# Altium schematic symbol library Altium_Lib.SchLib: 403 symbols (part 2 of 4)
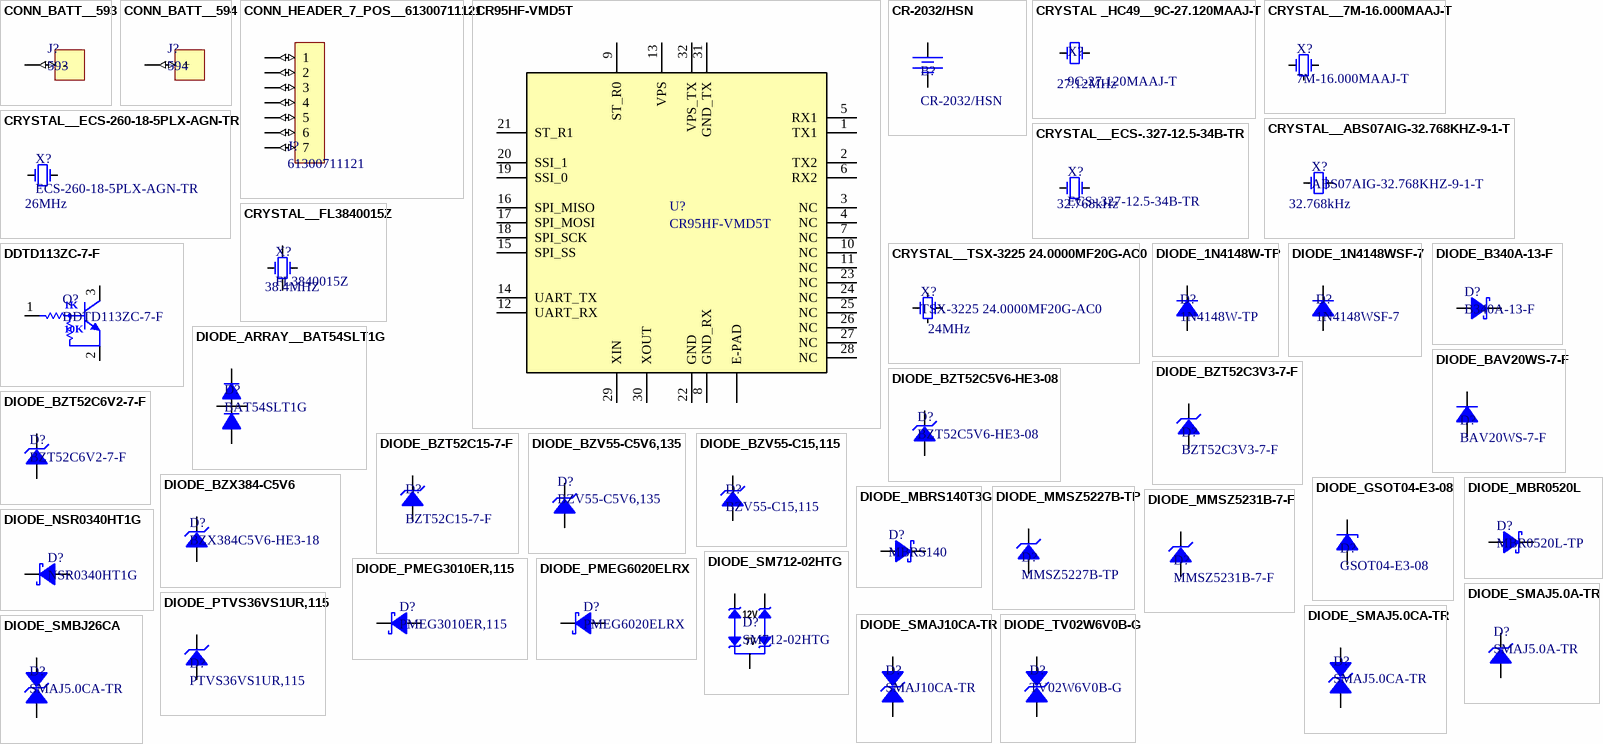
[diagram p12: symbols CONN_BATT__593 to DIODE_TV02W6V0B-G]

## CRYSTAL__ECS-.327-12.5-34B-TR
designator X?, comment ECS-.327-12.5-34B-TR  Frequency: 32.768kHz
CRYSTAL 32.7680KHZ 12.5PF SMD; Manufacturer: ECS Inc.; Operating Mode: Fundamental; Frequency Tolerance: ±20ppm; Size / Dimension: 0.126" L x 0.059" W (3.20mm x 1.50mm); Height - Seated (Max): 0.035" (0.90mm); Type: kHz Crystal (Tuning Fork); Ratings: -; RoHS: RoHS Compliant; Supplier: Digi-Key; Mounting Type: Surface Mount; Load Capacitance: 12.5pF; Packaging: Tape & Reel (TR); Part Status: Active; Frequency Stability: -; Manufacturer Part Number: ECS-.327-12.5-34B-TR; Operating Temperature: -40°C ~ 85°C; Category: Crystals, Oscillators, Resonators; Package / Case: 2-SMD, No Lead; ComponentLink1URL: http://www.ecsxtal.com/store/pdf/ecx-31b.pdf; ComponentLink1Description: http://www.ecsxtal.com/store/pdf/ecx-31b.pdf; Pricing: 3000=0.2445, 6000=0.23635, 15000=0.2282 (USD); Stock: 306000; Supplier Part Number: XC1617TR-ND
footprint XTAL_3.2mm_1.5mm_2pad
pins: 1 OSC1, 2  OSC2

## CRYSTAL__FL3840015Z
designator X?, comment FL3840015Z  Frequency: 38.4MHZ
CRYSTAL 38.4MHZ 10PF SMD; Manufacturer: Diodes Incorporated; Frequency Tolerance: ±10ppm; Operating Mode: Fundamental; Package / Case: 4-SMD, No Lead; Load Capacitance: 10pF; RoHS: RoHS Compliant; Part Status: Active; Supplier: Digi-Key; Ratings: -; Operating Temperature: -30°C ~ 85°C; Packaging: Tape & Reel (TR); Type: MHz Crystal; Category: Crystals, Oscillators, Resonators; Frequency Stability: ±10ppm; Mounting Type: Surface Mount; Manufacturer Part Number: FL3840015Z; Height - Seated (Max): 0.030" (0.75mm); Size / Dimension: 0.126" L x 0.098" W (3.20mm x 2.50mm); ComponentLink1URL: https://media.digikey.com/pdf/Data%20Sheets/Pericom%20PDFs/FL3840015Z_VerA.pdf; ComponentLink1Description: https://media.digikey.com/pdf/Data%20Sheets/Pericom%20PDFs/FL3840015Z_VerA.pdf; Pricing: 3000=0.345, 6000=0.3335, 15000=0.322 (USD); Stock: 6000; Supplier Part Number: FL3840015ZTR-ND
footprint XTAL_3.2mm_2.5mm_4pad
pins: 1 OSC1, 2 GND (power), 3  OSC2, 4 GND (power)

## CRYSTAL__TSX-3225 24.0000MF20G-AC0
designator X?, comment TSX-3225 24.0000MF20G-AC0  Frequency: 24MHz
CRYSTAL 24.0000MHZ 9PF SMD; Manufacturer: EPSON; Frequency Stability: ±20ppm; Operating Mode: Fundamental; Frequency Tolerance: ±10ppm; Ratings: -; Height - Seated (Max): 0.024" (0.60mm); Size / Dimension: 0.126" L x 0.098" W (3.20mm x 2.50mm); Type: MHz Crystal; Package / Case: 4-SMD, No Lead; Load Capacitance: 9pF; Part Status: Active; Supplier: Digi-Key; Packaging: Tape & Reel (TR); RoHS: RoHS Compliant; Operating Temperature: -40°C ~ 105°C; Mounting Type: Surface Mount; Category: Crystals, Oscillators, Resonators; Manufacturer Part Number: TSX-3225 24.0000MF20G-AC0; ComponentLink1URL: https://support.epson.biz/td/api/doc_check.php?dl=brief_FA-238V_en.pdf; ComponentLink1Description: https://support.epson.biz/td/api/doc_check.php?dl=brief_FA-238V_en.pdf; Pricing: 1000=0.272, 3000=0.255, 5000=0.2465, 10000=0.238 (USD); Supplier Part Number: SER4185TR-ND
footprint XTAL_3.2mm_2.5mm_4pad
pins: 1 OSC1, 2 GND (power), 3  OSC2, 4 GND (power)

## DDTD113ZC-7-F
designator Q?
TRANS PREBIAS NPN 200MW SOT23-3; Manufacturer: Diodes Incorporated; Transistor Type: NPN - Pre-Biased; DC Current Gain (hFE) (Min) @ Ic, Vce: 56 @ 50mA, 5V; Current - Collector Cutoff (Max): 500nA; Vce Saturation (Max) @ Ib, Ic: 300mV @ 2.5mA, 50mA; Part Status: Active; Supplier: Digi-Key; Category: Discrete Semiconductor Products; Supplier Device Package: SOT-23-3; Package / Case: TO-236-3, SC-59, SOT-23-3; RoHS: RoHS Compliant; Packaging: Tape & Reel (TR); Mounting Type: Surface Mount; Manufacturer Part Number: DDTD113ZC-7-F; Base Part Number: DTD113; ComponentLink1URL: https://www.diodes.com/assets/Datasheets/ds30384.pdf; ComponentLink1Description: https://www.diodes.com/assets/Datasheets/ds30384.pdf; Pricing: 3000=0.05566, 6000=0.0484, 15000=0.04114, 30000=0.03872, 75000=0.0363, 150000=0.03146 (USD); Supplier Part Number: DDTD113ZC-7FDITR-ND
footprint SOT23_L (SOT23, 3-Leads, Body 2.9x1.3mm, Pitch 0.95mm, Lead Span 2.3mm, IPC High Density)
pins: 1 B, 2 E, 3 C
text: 1K; 10K

## DIODE_1N4148W-TP
designator D?, comment 1N4148W-TP
DIODE GEN PURP 100V 150MA SOD123; Manufacturer: Micro Commercial Co; Capacitance @ Vr, F: 2pF @ 0V, 1MHz; Diode Type: Standard; Speed: Small Signal =< 200mA (Io), Any Speed; Supplier: Digi-Key; Mounting Type: Surface Mount; Base Part Number: 1N4148W; Operating Temperature - Junction: -65°C ~ 150°C; Supplier Device Package: SOD-123; Current - Average Rectified (Io): 150mA; RoHS: RoHS Compliant; Manufacturer Part Number: 1N4148W-TP; Package / Case: SOD-123; Packaging: Cut Tape (CT); Part Status: Active; Category: Discrete Semiconductor Products; Pricing: 1=0.14, 10=0.131, 100=0.0856, 500=0.04186, 1000=0.02854 (USD); ComponentLink1URL: http://www.mccsemi.com/up_pdf/1N4148W(SOD123).pdf; ComponentLink1Description: http://www.mccsemi.com/up_pdf/1N4148W(SOD123).pdf; Stock: 1856917; Supplier Part Number: 1N4148WTPMSCT-ND
footprint SOD123
pins: 1 A, 2 K

## DIODE_1N4148WSF-7
designator D?, comment 1N4148WSF-7
DIODE GEN PURP 100V 250MA SOD323; Manufacturer: Diodes; Reverse Recovery Time: 4ns; Peak Non-Repetitive Surge Current: 4A; Element Configuration: Single; Supplier 1: Avnet; Manufacturer Part Number: 1N4148WSF-7; Stock 1: 0; Pricing 1: 3000=0.0321, 6000=0.0289, 12000=0.0289, 18000=0.0251, 24000=0.0251, 30000=0.0225, 300000=0.02 (USD); Mount: Surface Mount; Case/Package: SOD; Number of Pins: 2; Contact Plating: Tin,Matte; Min Operating Temperature: -55°C; Max Operating Temperature: 150°C; Package Quantity: 3000; Packaging: Tape and Reel; Forward Current: 250mA; Average Rectified Current: 250mA; Max Repetitive Reverse Voltage (Vrrm): 100V; Max Reverse Voltage (DC): 100V; Lead Free: Lead Free; RoHS Compliant: Yes; Supplier Part Number 1: 1N4148WSF-7
footprint SOD323F__SC90
pins: 1 A, 2 K

## DIODE_ARRAY__BAT54SLT1G
designator D?, comment BAT54SLT1G
DIODE ARRAY SCHOTTKY 30V SOT23-3; Manufacturer: ON Semiconductor; Current - Average Rectified (Io) (per Diode): 200mA (DC); Current - Reverse Leakage @ Vr: 2µA @ 25V; Diode Configuration: 1 Pair Series Connection; Reverse Recovery Time (trr): 5ns; Speed: Small Signal =< 200mA (Io), Any Speed; Voltage - Forward (Vf) (Max) @ If: 800mV @ 100mA; Category: Discrete Semiconductor Products; Diode Type: Schottky; Manufacturer Part Number: BAT54SLT1G; Mounting Type: Surface Mount; Operating Temperature - Junction: 125°C (Max); Package / Case: TO-236-3, SC-59, SOT-23-3; Packaging: Tape & Reel (TR); Part Status: Active; RoHS: RoHS Compliant; Supplier: Digi-Key; Supplier Device Package: SOT-23-3 (TO-236); Voltage - DC Reverse (Vr) (Max): 30V; ComponentLink1URL: http://www.onsemi.com/pub_link/Collateral/BAT54SLT1-D.PDF; ComponentLink1Description: http://www.onsemi.com/pub_link/Collateral/BAT54SLT1-D.PDF; Pricing: 3000=0.02984, 6000=0.02691, 15000=0.0234, 30000=0.02106, 75000=0.01872, 150000=0.01556 (USD); Supplier Part Number: BAT54SLT1GOSTR-ND
footprint SOT23_L (SOT23, 3-Leads, Body 2.9x1.3mm, Pitch 0.95mm, Lead Span 2.3mm, IPC High Density)
pins: 1 A, 2 C, 3 C/A, 3 C/A

## DIODE_B340A-13-F
designator D?, comment B340A-13-F
DIODE SCHOTTKY 40V 3A SMA; Manufacturer: Diodes Incorporated; Capacitance @ Vr, F: 200pF @ 4V, 1MHz; Current - Reverse Leakage @ Vr: 500µA @ 40V; Speed: Fast Recovery =< 500ns, > 200mA (Io); Voltage - Forward (Vf) (Max) @ If: 500mV @ 3A; Category: Discrete Semiconductor Products; Current - Average Rectified (Io): 3A; Diode Type: Schottky; Mounting Type: Surface Mount; Manufacturer Part Number: B340A-13-F; Operating Temperature - Junction: -55°C ~ 150°C; Package / Case: DO-214AC, SMA; Packaging: Tape & Reel (TR); Part Status: Active; Reverse Recovery Time (trr): -; RoHS: RoHS Compliant; Supplier: Digi-Key; Supplier Device Package: SMA; Voltage - DC Reverse (Vr) (Max): 40V; ComponentLink1URL: http://www.diodes.com/_files/datasheets/ds30891.pdf; ComponentLink1Description: http://www.diodes.com/_files/datasheets/ds30891.pdf; Pricing: 5000=0.10852, 10000=0.10152 (USD); Supplier Part Number: B340A-FDITR-ND
footprint DO-214AC-SMA
pins: 1 A, 2 K

## DIODE_BAV20WS-7-F
designator D?, comment BAV20WS-7-F
DIODE GEN PURP 150V 200MA SOD323; Manufacturer: Diodes Incorporated; Speed: Small Signal =< 200mA (Io), Any Speed; Diode Type: Standard; Capacitance @ Vr, F: 5pF @ 0V, 1MHz; Supplier: Digi-Key; Base Part Number: BAV20WS; RoHS: RoHS Compliant; Current - Average Rectified (Io): 200mA; Part Status: Active; Package / Case: SC-76, SOD-323; Packaging: Cut Tape (CT); Operating Temperature - Junction: -65°C ~ 150°C; Mounting Type: Surface Mount; Manufacturer Part Number: BAV20WS-7-F; Supplier Device Package: SOD-323; Category: Discrete Semiconductor Products; ComponentLink1URL: https://www.diodes.com/assets/Datasheets/ds30119.pdf; ComponentLink1Description: https://www.diodes.com/assets/Datasheets/ds30119.pdf; Pricing: 1=0.3, 10=0.248, 100=0.1333, 500=0.0891, 1000=0.0619 (USD); Supplier Part Number: BAV20WS-FDICT-ND
footprint SOD123
pins: 1 A, 2 K

## DIODE_BZT52C3V3-7-F
designator D?, comment BZT52C3V3-7-F
DIODE ZENER 3.3V 500MW SOD123; Manufacturer: Diodes Incorporated; Tolerance: ±6%; Manufacturer Part Number: BZT52C3V3-7-F; Operating Temperature: -65°C ~ 150°C; Mounting Type: Surface Mount; Package / Case: SOD-123; RoHS: RoHS Compliant; Supplier: Digi-Key; Category: Discrete Semiconductor Products; Packaging: Tape & Reel (TR); Base Part Number: BZT52C3V3; Part Status: Active; Supplier Device Package: SOD-123; ComponentLink1URL: https://www.diodes.com/assets/Datasheets/ds18004.pdf; ComponentLink1Description: https://www.diodes.com/assets/Datasheets/ds18004.pdf; Pricing: 3000=0.04106, 6000=0.03703, 15000=0.0322, 30000=0.02898, 75000=0.02576, 150000=0.02141 (USD); Supplier Part Number: BZT52C3V3-FDITR-ND
footprint SOD123
pins: 1 T1, 2 T2

## DIODE_BZT52C5V6-HE3-08
designator D?, comment BZT52C5V6-HE3-08
DIODE ZENER 5.6V 410MW SOD123; Manufacturer: Vishay; Voltage Tolerance: 5%; Zener Current: 59mA; Power Dissipation: 500mW; Max Reverse Leakage Current: 100nA; Impedance: 10R; Element Configuration: Single; Supplier 1: Avnet; Manufacturer Part Number: BZT52C5V6-HE3-08; Stock 1: 0; Pricing 1: 3000=0.0519, 6000=0.0449, 12000=0.0447, 18000=0.0378, 24000=0.0376, 30000=0.0352, 300000=0.0328 (USD); Mount: Surface Mount; Number of Pins: 2; Min Operating Temperature: -55°C; Max Operating Temperature: 150°C; Packaging: Tape and Reel; Package Quantity: 3000; Zener Voltage: 5.6V; Max Power Dissipation: 410mW; Tolerance: 5%; ComponentLink1URL: http://www.mouser.com/ds/2/427/bzt52-106265.pdf?src-supplier=Mouser; ComponentLink1Description: http://www.mouser.com/ds/2/427/bzt52-106265.pdf?src-supplier=Mouser; Supplier Part Number 1: BZT52C5V6-HE3-08
footprint SOD123
pins: 1 T1, 2 T2

## DIODE_BZT52C6V2-7-F
designator D?, comment BZT52C6V2-7-F
DIODE ZENER 6.2V 500MW SOD123; Manufacturer: Diodes Incorporated; Voltage - Forward (Vf) (Max) @ If: 900mV @ 10mA; Current - Reverse Leakage @ Vr: 3µA @ 4V; Tolerance: ±6%; Impedance (Max) (Zzt): 10 Ohm; Manufacturer Part Number: BZT52C6V2-7-F; RoHS: RoHS Compliant; Supplier: Digi-Key; Category: Discrete Semiconductor Products; Supplier Device Package: SOD-123; Package / Case: SOD-123; Packaging: Tape & Reel (TR); Operating Temperature: -65°C ~ 150°C; Part Status: Active; Voltage - Zener (Nom) (Vz): 6.2V; Mounting Type: Surface Mount; Power - Max: 500mW; ComponentLink1URL: http://www.diodes.com/_files/datasheets/ds18004.pdf; ComponentLink1Description: http://www.diodes.com/_files/datasheets/ds18004.pdf; Pricing: 3000=0.0345, 6000=0.03, 15000=0.0255, 30000=0.024, 75000=0.0225, 150000=0.0195 (USD); Supplier Part Number: BZT52C6V2-FDITR-ND
footprint SOD123
pins: 1 T1, 2 T2

## DIODE_BZT52C15-7-F
designator D?, comment BZT52C15-7-F
DIODE ZENER 15V 500MW SOD123; Manufacturer: Diodes Incorporated; Configuration: Single; Zener Current: 5 mA; Ir - Reverse Current: 100 nA; Qualification: AEC-Q101; Voltage Temperature Coefficient: 11.1 mV/C; Voltage Tolerance: 6 %; Zz - Zener Impedance: 30 Ohms; Supplier 1: Mouser; Manufacturer Part Number: BZT52C15-7-F; RoHS: RoHS Compliant; Category: Zener Diodes; Stock 1: 56781; Pricing 1: 1=0.200, 10=0.135, 100=0.057, 1000=0.039, 3000=0.030, 9000=0.026, 24000=0.024, 45000=0.023 (USD); Height: 1.35 mm; Length: 2.85 mm; Package / Case: SOD-123-2; Packaging: Cut Tape; Series: BZT52C2V0 - BZT52C51; Termination Style: SMD/SMT; Width: 1.7 mm; Brand: Diodes Incorporated; Mounting Style: SMD/SMT; Maximum Operating Temperature: + 150 C; Minimum Operating Temperature: - 65 C; Pd - Power Dissipation: 500 mW; Product Type: Zener Diodes; Standard Pack Qty: 3000; Subcategory: Diodes & Rectifiers; Test Current: 5 mA; Vz - Zener Voltage: 15 V; RoHS - Mouser: Y; Minimum Order Quantity: 1; Reeling: True; ComponentLink1URL: https://www.mouser.com/datasheet/2/115/ds18004-1142534.pdf; ComponentLink1Description: https://www.mouser.com/datasheet/2/115/ds18004-1142534.pdf; Supplier Part Number 1: 621-BZT52C15-F
footprint SOD123
pins: 1 T1, 2 T2

## DIODE_BZV55-C5V6,135
designator D?, comment BZV55-C5V6,135
DIODE ZENER 5.6V 500MW SOD80; Manufacturer: Nexperia USA Inc.; Tolerance: ±5%; Voltage - Forward (Vf) (Max) @ If: 900mV @ 10mA; Current - Reverse Leakage @ Vr: 1µA @ 2V; Part Status: Active; Packaging: Tape & Reel (TR); Supplier: Digi-Key; Manufacturer Part Number: BZV55-C5V6,135; Operating Temperature: -65°C ~ 200°C; Category: Discrete Semiconductor Products; RoHS: RoHS Compliant; Base Part Number: BZV55C5V6; Supplier Device Package: SOD-80C; Package / Case: DO-213AC, MINI-MELF, SOD-80; Mounting Type: Surface Mount; ComponentLink1URL: https://assets.nexperia.com/documents/data-sheet/BZV55_SER.pdf; ComponentLink1Description: https://assets.nexperia.com/documents/data-sheet/BZV55_SER.pdf; Pricing: 10000=0.026, 30000=0.0234, 50000=0.0208, 100000=0.0195, 250000=0.01729 (USD); Supplier Part Number: 1727-1888-2-ND
footprint SOD80C (Metal Electrode Face (MELF) Diode; Body 3.5 x 1.6 mm (LxDia))
pins: 1 T1, 2 T2

## DIODE_BZV55-C15,115
designator D?, comment BZV55-C15,115
DIODE ZENER 15V 500MW SOD80C; Manufacturer: Nexperia USA Inc.; Current - Reverse Leakage @ Vr: 50nA @ 10.5V; Tolerance: ±5%; Voltage - Forward (Vf) (Max) @ If: 900mV @ 10mA; Category: Discrete Semiconductor Products; Manufacturer Part Number: BZV55-C15,115; Power - Max: 500mW; Part Status: Active; Supplier: Digi-Key; RoHS: RoHS Compliant; Packaging: Tape & Reel (TR); Operating Temperature: -65°C ~ 200°C; Supplier Device Package: SOD-80C; Mounting Type: Surface Mount; Package / Case: DO-213AC, MINI-MELF, SOD-80; ComponentLink1URL: http://assets.nexperia.com/documents/data-sheet/BZV55_SER.pdf; ComponentLink1Description: http://assets.nexperia.com/documents/data-sheet/BZV55_SER.pdf; Supplier Part Number: 1727-4962-2-ND
footprint SOD80C (Metal Electrode Face (MELF) Diode; Body 3.5 x 1.6 mm (LxDia))
pins: 1 T1, 2 T2

## DIODE_BZX384-C5V6
designator D?, comment BZX384C5V6-HE3-18
DIODE ZENER 5.6V 200MW SOD323; Manufacturer: Vishay Semiconductor Diodes Division; Tolerance: ±5%; Current - Reverse Leakage @ Vr: 1µA @ 2V; Power - Max: 200mW; Part Status: Active; Package / Case: SC-76, SOD-323; Category: Discrete Semiconductor Products; RoHS: RoHS Compliant; Manufacturer Part Number: BZX384C5V6-HE3-18; Packaging: Tape & Reel (TR); Supplier: Digi-Key; Voltage - Forward (Vf) (Max) @ If: -; Mounting Type: Surface Mount; Supplier Device Package: SOD-323; Operating Temperature: -55°C ~ 150°C; ComponentLink1URL: http://www.vishay.com/docs/85764/bzx384.pdf; ComponentLink1Description: http://www.vishay.com/docs/85764/bzx384.pdf; Pricing: 10000=0.03213 (USD); Supplier Part Number: BZX384C5V6-HE3-18-ND
footprint SOD323F__SC90
pins: 1 T1, 2 T2

## DIODE_GSOT04-E3-08
designator D?, comment GSOT04-E3-08
TVS DIODE 4V 14.3V SOT23-3; Manufacturer: Vishay Semiconductor Diodes Division; Power Line Protection: No; Capacitance @ Frequency: 310pF @ 1MHz; Power - Peak Pulse: 429W; Voltage - Breakdown (Min): 5V; Voltage - Reverse Standoff (Typ): 4V (Max); Current - Peak Pulse (10/1000µs): 30A (8/20µs); Type: Zener; Package / Case: TO-236-3, SC-59, SOT-23-3; Applications: General Purpose; Supplier Device Package: SOT-23-3; Operating Temperature: -40°C ~ 125°C (TJ); Mounting Type: Surface Mount; Category: Circuit Protection; Packaging: Cut Tape (CT); Voltage - Clamping (Max) @ Ipp: 14.3V; Supplier: Digi-Key; Manufacturer Part Number: GSOT04-E3-08; Part Status: Active; RoHS: RoHS Compliant; ComponentLink1URL: http://www.vishay.com/docs/85807/gsot03.pdf; ComponentLink1Description: http://www.vishay.com/docs/85807/gsot03.pdf; Pricing: 1=0.39, 10=0.297, 25=0.2676, 100=0.1849, 250=0.15572, 500=0.12654, 1000=0.09734 (USD); Supplier Part Number: GSOT04-E3-08CT-ND
footprint SOT23_L (SOT23, 3-Leads, Body 2.9x1.3mm, Pitch 0.95mm, Lead Span 2.3mm, IPC High Density)
pins: 1 A, 3 K

## DIODE_MBR0520L
designator D?, comment MBR0520L-TP
DIODE SCHOTTKY 20V 500MA SOD123; Manufacturer: Micro Commercial Co; Capacitance @ Vr, F: 170pF @ 0V, 1MHz; Speed: Fast Recovery =< 500ns, > 200mA (Io); Category: Discrete Semiconductor Products; Supplier: Digi-Key; Packaging: Tape & Reel (TR); Mounting Type: Surface Mount; Supplier Device Package: SOD-123; Diode Type: Schottky; Package / Case: SOD-123; Manufacturer Part Number: MBR0520L-TP; Current - Average Rectified (Io): 500mA; Base Part Number: MBR0520; Operating Temperature - Junction: -65°C ~ 125°C; RoHS: RoHS Compliant; Part Status: Active; ComponentLink1URL: http://www.mccsemi.com/up_pdf/MBR0520L~MBR0540L(SOD-123).pdf; ComponentLink1Description: http://www.mccsemi.com/up_pdf/MBR0520L~MBR0540L(SOD-123).pdf; Pricing: 3000=0.063, 6000=0.0567, 15000=0.0504, 30000=0.04725, 75000=0.042 (USD); Supplier Part Number: MBR0520L-TPMSTR-ND
footprint SOD123
pins: 1 A, 2 K

## DIODE_MBRS140T3G
designator D?, comment MBRS140
ON SEMICONDUCTOR - MBRS140 - DIODE, SCHOTTKY, 1A, 40V, SMD; Forward Voltage: 600; Junction Temperature Tj Max: 125; Product Range: MBRS1 Series; Current Ifsm: 40; No. of Pins: 2; Diode Case Style: DO-214; SVHC: No SVHC (15-Jun-2015); Diode Configuration: Single; Forward Current If(AV): 1; Operating Temperature Range: -65°C to +125; MSL: MSL 1 - Unlimited; Operating Temperature Min: -65; Termination Type: Surface Mount Device<!--FANDB--><div class="features-and-benefits-container"><div class="features-and-benefits-desc-container"><span class="features-and-benefits-container-desc">Schottky Rectifier, 40 V, 1 A, Single, DO-214AA, 2 Pins, 600 mV</span></div><div class="features-and-benefits-description"><span class="features-benefits-value">The MBRS140 is a surface-mount Schottky Power Rectifier with J-bend leads. This power rectifier is general usage and suitable for many different applications. Colour band denotes cathode end polarity.</span></div><div class="features-and-benefits-list"><ul class="features-and-benefits-list-list"><li class="features-and-benefits-list-item">1.5W Power dissipation</li><li class="features-and-benefits-list-item">12; Automotive Qualification Standard: -; Forward Voltage VF Max: 600; Packaging: Cut Tape; Operating Temperature Max: 125; Diode Type: Schottky; Forward Surge Current Ifsm Max: 40; Manufacturer: ON SEMICONDUCTOR; Manufacturer Part Number: MBRS140; Supplier: Farnell; RoHS: YES; Repetitive Reverse Voltage Vrrm Max: 40; ComponentLink1URL: http://www.farnell.com/datasheets/2303885.pdf; ComponentLink1Description: http://www.farnell.com/datasheets/2303885.pdf; Pricing: 5=0.277, 50=0.166, 250=0.132, 500=0.108, 1500=0.085 (GBP); Supplier Part Number: 1467526
footprint DO-214AA-SMB
pins: 1 A, 2 K

## DIODE_MMSZ5227B-TP
designator D?, comment MMSZ5227B-TP
DIODE ZENER 3.6V 500MW SOD123; Manufacturer: Micro Commercial Co; Tolerance: ±5%; Category: Discrete Semiconductor Products; Package / Case: SOD-123; Mounting Type: Surface Mount; Operating Temperature: -55°C ~ 150°C; RoHS: RoHS Compliant; Packaging: Cut Tape (CT); Supplier Device Package: SOD-123; Part Status: Active; Manufacturer Part Number: MMSZ5227B-TP; Supplier: Digi-Key; ComponentLink1URL: http://www.mccsemi.com/up_pdf/MMSZ5221-MMSZ5267(SOD123)-J.pdf; ComponentLink1Description: http://www.mccsemi.com/up_pdf/MMSZ5221-MMSZ5267(SOD123)-J.pdf; Pricing: 1=0.22, 10=0.207, 25=0.15, 100=0.1175, 250=0.07524, 500=0.0647, 1000=0.04523 (USD); Supplier Part Number: MMSZ5227B-TPMSCT-ND
footprint SOD123
pins: 1 T1, 2 T2

## DIODE_MMSZ5231B-7-F
designator D?, comment MMSZ5231B-7-F
DIODE ZENER 5.1V 500MW SOD123; Manufacturer: Diodes Incorporated; Configuration: Single; Zener Current: 5 uA; Test Current: 20 mA; Vf - Forward Voltage: 900 mV; Voltage Tolerance: 5 %; Zz - Zener Impedance: 17 Ohms; Supplier 1: Mouser; Manufacturer Part Number: MMSZ5231B-7-F; RoHS: RoHS Compliant; Category: Zener Diodes; Stock 1: 234813; Pricing 1: 1=0.210, 10=0.144, 100=0.060, 1000=0.041, 3000=0.032, 9000=0.028, 24000=0.026, 45000=0.024 (USD); Height: 1.35 mm; Length: 3.85 mm; Package / Case: SOD-123-2; Packaging: Cut Tape; Series: MMSZ5231; Termination Style: SMD/SMT; Width: 1.7 mm; Brand: Diodes Incorporated; Mounting Style: SMD/SMT; Ir - Reverse Current: 5 uA; Maximum Operating Temperature: + 150 C; Minimum Operating Temperature: - 65 C; Pd - Power Dissipation: 500 mW; Product Type: Zener Diodes; Standard Pack Qty: 3000; Subcategory: Diodes & Rectifiers; Vz - Zener Voltage: 5.1 V; RoHS - Mouser: Y; Minimum Order Quantity: 1; Reeling: True; ComponentLink1URL: https://www.mouser.com/datasheet/2/115/ds18010-38133.pdf; ComponentLink1Description: https://www.mouser.com/datasheet/2/115/ds18010-38133.pdf; Supplier Part Number 1: 621-MMSZ5231B-F
footprint SOD123
pins: 1 T1, 2 T2

## DIODE_NSR0340HT1G
designator D?, comment NSR0340HT1G
DIODE SCHOTTKY 40V 250MA SOD323; Manufacturer: ON Semiconductor; Speed: Fast Recovery =< 500ns, > 200mA (Io); Capacitance @ Vr, F: 6pF @ 10V, 1MHz; Current - Average Rectified (Io): 250mA (DC); Supplier Device Package: SOD-323; Package / Case: SC-76, SOD-323; Operating Temperature - Junction: -55°C ~ 150°C; Mounting Type: Surface Mount; Packaging: Tape & Reel (TR); Base Part Number: NSR0340; RoHS: RoHS Compliant; Manufacturer Part Number: NSR0340HT1G; Category: Discrete Semiconductor Products; Part Status: Active; Diode Type: Schottky; Supplier: Digi-Key; ComponentLink1URL: http://www.onsemi.com/pub/Collateral/NSR0340H-D.PDF; ComponentLink1Description: http://www.onsemi.com/pub/Collateral/NSR0340H-D.PDF; Pricing: 3000=0.0413, 6000=0.03591, 15000=0.03052, 30000=0.02873, 75000=0.02693, 150000=0.02394 (USD); Supplier Part Number: NSR0340HT1GOSTR-ND
footprint SOD323
pins: 1 A, 2 K

## DIODE_PMEG3010ER,115
designator D?, comment PMEG3010ER,115
DIODE SCHOTTKY 30V 1A SOD123W; Manufacturer: Nexperia; Supplier 1: Avnet; Manufacturer Part Number: PMEG3010ER,115; Stock 1: 0; Pricing 1: 3000=0.0754, 6000=0.0716, 12000=0.0678, 18000=0.064, 24000=0.0602, 30000=0.0564, 300000=0.0526 (USD); RoHS Compliant: Yes; Supplier Part Number 1: PMEG3010ER,115
footprint SOD123W
pins: 1 K, 2 A

## DIODE_PMEG6020ELRX
designator D?, comment PMEG6020ELRX
DIODE SCHOTTKY 60V 2A CFP3; Manufacturer: Nexperia; Supplier 1: Avnet; Manufacturer Part Number: PMEG6020ELRX; Stock 1: 0; Pricing 1: 12000=0.0781, 18000=0.0762, 30000=0.0747, 60000=0.0732, 120000=0.0711, 600000=0.0691, 1200000=0.0671 (USD); RoHS Compliant: Yes; ComponentLink1URL: https://assets.nexperia.com/documents/data-sheet/PMEG6020ELR.pdf?src-supplier=Digi-Key; ComponentLink1Description: https://assets.nexperia.com/documents/data-sheet/PMEG6020ELR.pdf?src-supplier=Digi-Key; ComponentLink2URL: http://www.farnell.com/datasheets/2168440.pdf?src-supplier=Farnell; ComponentLink2Description: http://www.farnell.com/datasheets/2168440.pdf?src-supplier=Farnell; ComponentLink3URL: http://www.farnell.com/datasheets/2168440.pdf?src-supplier=Newark; ComponentLink3Description: http://www.farnell.com/datasheets/2168440.pdf?src-supplier=Newark; Supplier Part Number 1: PMEG6020ELRX
footprint SOD123W
pins: 1 K, 2 A

## DIODE_PTVS36VS1UR,115
designator D?, comment PTVS36VS1UR,115
TVS DIODE 36V 58.1V CFP3; Manufacturer: Nexperia USA Inc.; Power - Peak Pulse: 400W; Current - Peak Pulse (10/1000µs): 6.9A; Power Line Protection: No; Voltage - Breakdown (Min): 40V; Type: Zener; Manufacturer Part Number: PTVS36VS1UR,115; Supplier: Digi-Key; Category: Circuit Protection; Mounting Type: Surface Mount; Part Status: Active; Package / Case: SOD-123W; Voltage - Clamping (Max) @ Ipp: 58.1V; Packaging: Digi-Reel®; Applications: Automotive; Capacitance @ Frequency: -; Supplier Device Package: CFP3; Base Part Number: PTVS*S1UR; RoHS: RoHS Compliant; Voltage - Reverse Standoff (Typ): 36V; Operating Temperature: -55°C ~ 150°C (TA); ComponentLink1URL: https://assets.nexperia.com/documents/data-sheet/PTVSXS1UR_SER.pdf; ComponentLink1Description: https://assets.nexperia.com/documents/data-sheet/PTVSXS1UR_SER.pdf; Pricing: 1=0.44, 10=0.33, 100=0.2055, 500=0.1406, 1000=0.10815 (USD); Supplier Part Number: 1727-5872-6-ND
footprint SOD123
pins: 1 A, 2 K

## DIODE_SM712-02HTG
designator D?, comment SM712-02HTG
TVS DIODE 12VWM 31VC SOT23; Manufacturer: Littelfuse Inc.; Voltage - Breakdown (Min): 13.3V; Voltage - Reverse Standoff (Typ): 12V; Current - Peak Pulse (10/1000µs): 19A (8/20µs); Voltage - Clamping (Max) @ Ipp: 31V; Type: Zener; Capacitance @ Frequency: 75pF @ 1MHz; Power Line Protection: No; Power - Peak Pulse: 600W; Operating Temperature: -40°C ~ 125°C (TJ); Package / Case: TO-236-3, SC-59, SOT-23-3; Part Status: Active; RoHS: RoHS Compliant; Manufacturer Part Number: SM712-02HTG; Supplier: Digi-Key; Category: Circuit Protection; Packaging: Tape & Reel (TR); Applications: Automotive; Mounting Type: Surface Mount; Supplier Device Package: SOT-23-3; ComponentLink1URL: http://www.littelfuse.com/~/media/electronics/datasheets/tvs_diode_arrays/littelfuse_tvs_diode_array_sm712_datasheet.pdf.pdf; ComponentLink1Description: http://www.littelfuse.com/~/media/electronics/datasheets/tvs_diode_arrays/littelfuse_tvs_diode_array_sm712_datasheet.pdf.pdf; Supplier Part Number: F6450TR-ND
footprint SOT23_L (SOT23, 3-Leads, Body 2.9x1.3mm, Pitch 0.95mm, Lead Span 2.3mm, IPC High Density)
pins: 1 T1, 2 T2, 3 GND
text: 7V

## DIODE_SMAJ5.0A-TR
designator D?, comment SMAJ5.0A-TR
TVS DIODE 5VWM 13.4VC DO214AC; Manufacturer: STMicroelectronics; Voltage - Clamping (Max) @ Ipp: 13.4V; Type: Zener; Current - Peak Pulse (10/1000µs): 174A (8/20µs); Power - Peak Pulse: 400W; Voltage - Breakdown (Min): 6.4V; Power Line Protection: No; Voltage - Reverse Standoff (Typ): 5V; Supplier: Digi-Key; Packaging: Tape & Reel (TR); Applications: General Purpose; Mounting Type: Surface Mount; Capacitance @ Frequency: -; RoHS: RoHS Compliant; Manufacturer Part Number: SMAJ5.0A-TR; Package / Case: DO-214AC, SMA; Category: Circuit Protection; Supplier Device Package: SMA (DO-214AC); Operating Temperature: -55°C ~ 150°C (TJ); Base Part Number: SMAJ; Part Status: Active; Pricing: 5000=0.09282, 10000=0.08463, 25000=0.07917, 50000=0.0728 (USD); ComponentLink1URL: http://www.st.com/content/ccc/resource/technical/document/datasheet/ff/c0/80/cc/19/4c/45/af/CD00001333.pdf/files/CD00001333.pdf/_jcr_content/translations/en.CD00001333.pdf; ComponentLink1Description: http://www.st.com/content/ccc/resource/technical/document/datasheet/ff/c0/80/cc/19/4c/45/af/CD00001333.pdf/files/CD00001333.pdf/_jcr_content/translations/en.CD00001333.pdf; Supplier Part Number: 497-2999-2-ND
footprint DO-214AC-SMA
pins: 1 A, 2 K

## DIODE_SMAJ5.0CA-TR
designator D?, comment SMAJ5.0CA-TR
TVS DIODE 5VWM 13.4VC SMA; Manufacturer: STMicroelectronics; Voltage - Clamping (Max) @ Ipp: 13.4V; Type: Zener; Power Line Protection: No; Voltage - Breakdown (Min): 6.4V; Current - Peak Pulse (10/1000µs): 174A (8/20µs); Power - Peak Pulse: 400W; Voltage - Reverse Standoff (Typ): 5V; Packaging: Tape & Reel (TR); Category: Circuit Protection; Supplier: Digi-Key; RoHS: RoHS Compliant; Manufacturer Part Number: SMAJ5.0CA-TR; Applications: General Purpose; Part Status: Active; Base Part Number: SMAJ; Operating Temperature: -55°C ~ 150°C (TJ); Mounting Type: Surface Mount; Package / Case: DO-214AC, SMA; Supplier Device Package: SMA (DO-214AC); Capacitance @ Frequency: -; ComponentLink1URL: http://www.st.com/content/ccc/resource/technical/document/datasheet/ff/c0/80/cc/19/4c/45/af/CD00001333.pdf/files/CD00001333.pdf/_jcr_content/translations/en.CD00001333.pdf; ComponentLink1Description: http://www.st.com/content/ccc/resource/technical/document/datasheet/ff/c0/80/cc/19/4c/45/af/CD00001333.pdf/files/CD00001333.pdf/_jcr_content/translations/en.CD00001333.pdf; Pricing: 5000=0.10579, 10000=0.09896, 25000=0.091 (USD); Supplier Part Number: 497-6508-2-ND
footprint DO-214AC-SMA -nonPOL
pins: 1 T1, 2 T2

## DIODE_SMAJ10CA-TR
designator D?, comment SMAJ10CA-TR
TVS DIODE 10VWM 21.7VC SMA; Manufacturer: STMicroelectronics; Type: Zener; Current - Peak Pulse (10/1000µs): 106A (8/20µs); Power - Peak Pulse: 400W; Voltage - Clamping (Max) @ Ipp: 21.7V; Voltage - Breakdown (Min): 11.1V; Voltage - Reverse Standoff (Typ): 10V; Power Line Protection: No; Part Status: Active; RoHS: RoHS Compliant; Packaging: Tape & Reel (TR); Category: Circuit Protection; Supplier: Digi-Key; Manufacturer Part Number: SMAJ10CA-TR; Applications: General Purpose; Supplier Device Package: SMA (DO-214AC); Mounting Type: Surface Mount; Capacitance @ Frequency: -; Base Part Number: SMAJ; Operating Temperature: -55°C ~ 150°C (TJ); Package / Case: DO-214AC, SMA; ComponentLink1URL: http://www.st.com/content/ccc/resource/technical/document/datasheet/ff/c0/80/cc/19/4c/45/af/CD00001333.pdf/files/CD00001333.pdf/_jcr_content/translations/en.CD00001333.pdf; ComponentLink1Description: http://www.st.com/content/ccc/resource/technical/document/datasheet/ff/c0/80/cc/19/4c/45/af/CD00001333.pdf/files/CD00001333.pdf/_jcr_content/translations/en.CD00001333.pdf; Pricing: 5000=0.09639, 10000=0.08789, 25000=0.08222, 50000=0.0756 (USD); Supplier Part Number: 497-14167-2-ND
footprint DO-214AC-SMA -nonPOL
pins: 1 T1, 2 T2

## DIODE_SMBJ26CA
designator D?, comment SMAJ5.0CA-TR
TVS DIODE 26VWM 42.1VC SMB; Manufacturer: STMicroelectronics; Power Line Protection: No; Voltage - Breakdown (Min): 6.4V; Power - Peak Pulse: 400W; Voltage - Clamping (Max) @ Ipp: 13.4V; Current - Peak Pulse (10/1000µs): 174A (8/20µs); Voltage - Reverse Standoff (Typ): 5V; Type: Zener; Supplier: Digi-Key; Package / Case: DO-214AC, SMA; Capacitance @ Frequency: -; Packaging: Tape & Reel (TR); Operating Temperature: -55°C ~ 150°C (TJ); Applications: General Purpose; Supplier Device Package: SMA (DO-214AC); Part Status: Active; RoHS: RoHS Compliant; Category: Circuit Protection; Mounting Type: Surface Mount; Manufacturer Part Number: SMAJ5.0CA-TR; ComponentLink1URL: http://www.littelfuse.com/~/media/electronics/datasheets/tvs_diodes/littelfuse_tvs_diode_smbj_datasheet.pdf.pdf; ComponentLink1Description: http://www.littelfuse.com/~/media/electronics/datasheets/tvs_diodes/littelfuse_tvs_diode_smbj_datasheet.pdf.pdf; Pricing: 5000=0.10579, 10000=0.09896, 25000=0.091 (USD); Supplier Part Number: 497-6508-2-ND; Base Part Number: SMAJ; ComponentLink2URL: http://www.st.com/content/ccc/resource/technical/document/datasheet/ff/c0/80/cc/19/4c/45/af/CD00001333.pdf/files/CD00001333.pdf/_jcr_content/translations/en.CD00001333.pdf; ComponentLink2Description: http://www.st.com/content/ccc/resource/technical/document/datasheet/ff/c0/80/cc/19/4c/45/af/CD00001333.pdf/files/CD00001333.pdf/_jcr_content/translations/en.CD00001333.pdf
footprint DO-214AA-SMB -nonPOL
pins: 1 T1, 2 T2

## DIODE_TV02W6V0B-G
designator D?, comment TV02W6V0B-G
TVS DIODE 6V 10.3V SOD123; Manufacturer: Comchip Technology; Power Line Protection: No; Voltage - Breakdown (Min): 6.67V; Type: Zener; Current - Peak Pulse (10/1000µs): 19.42A; Power - Peak Pulse: 200W; Applications: General Purpose; Capacitance @ Frequency: -; Mounting Type: Surface Mount; Package / Case: SOD-123; Manufacturer Part Number: TV02W6V0B-G; Voltage - Reverse Standoff (Typ): 6V; Supplier: Digi-Key; Category: Circuit Protection; Operating Temperature: -55°C ~ 150°C (TJ); Part Status: Active; Packaging: Cut Tape (CT); RoHS: RoHS Compliant; Supplier Device Package: SOD-123; Voltage - Clamping (Max) @ Ipp: 10.3V; Pricing: 1=0.41, 10=0.325, 25=0.2744, 100=0.2233, 250=0.18504, 500=0.15314, 1000=0.11486 (USD); Supplier Part Number: 641-2008-1-ND
footprint SOD123-BIDERECTIONAL
pins: 1 T1, 2 T2

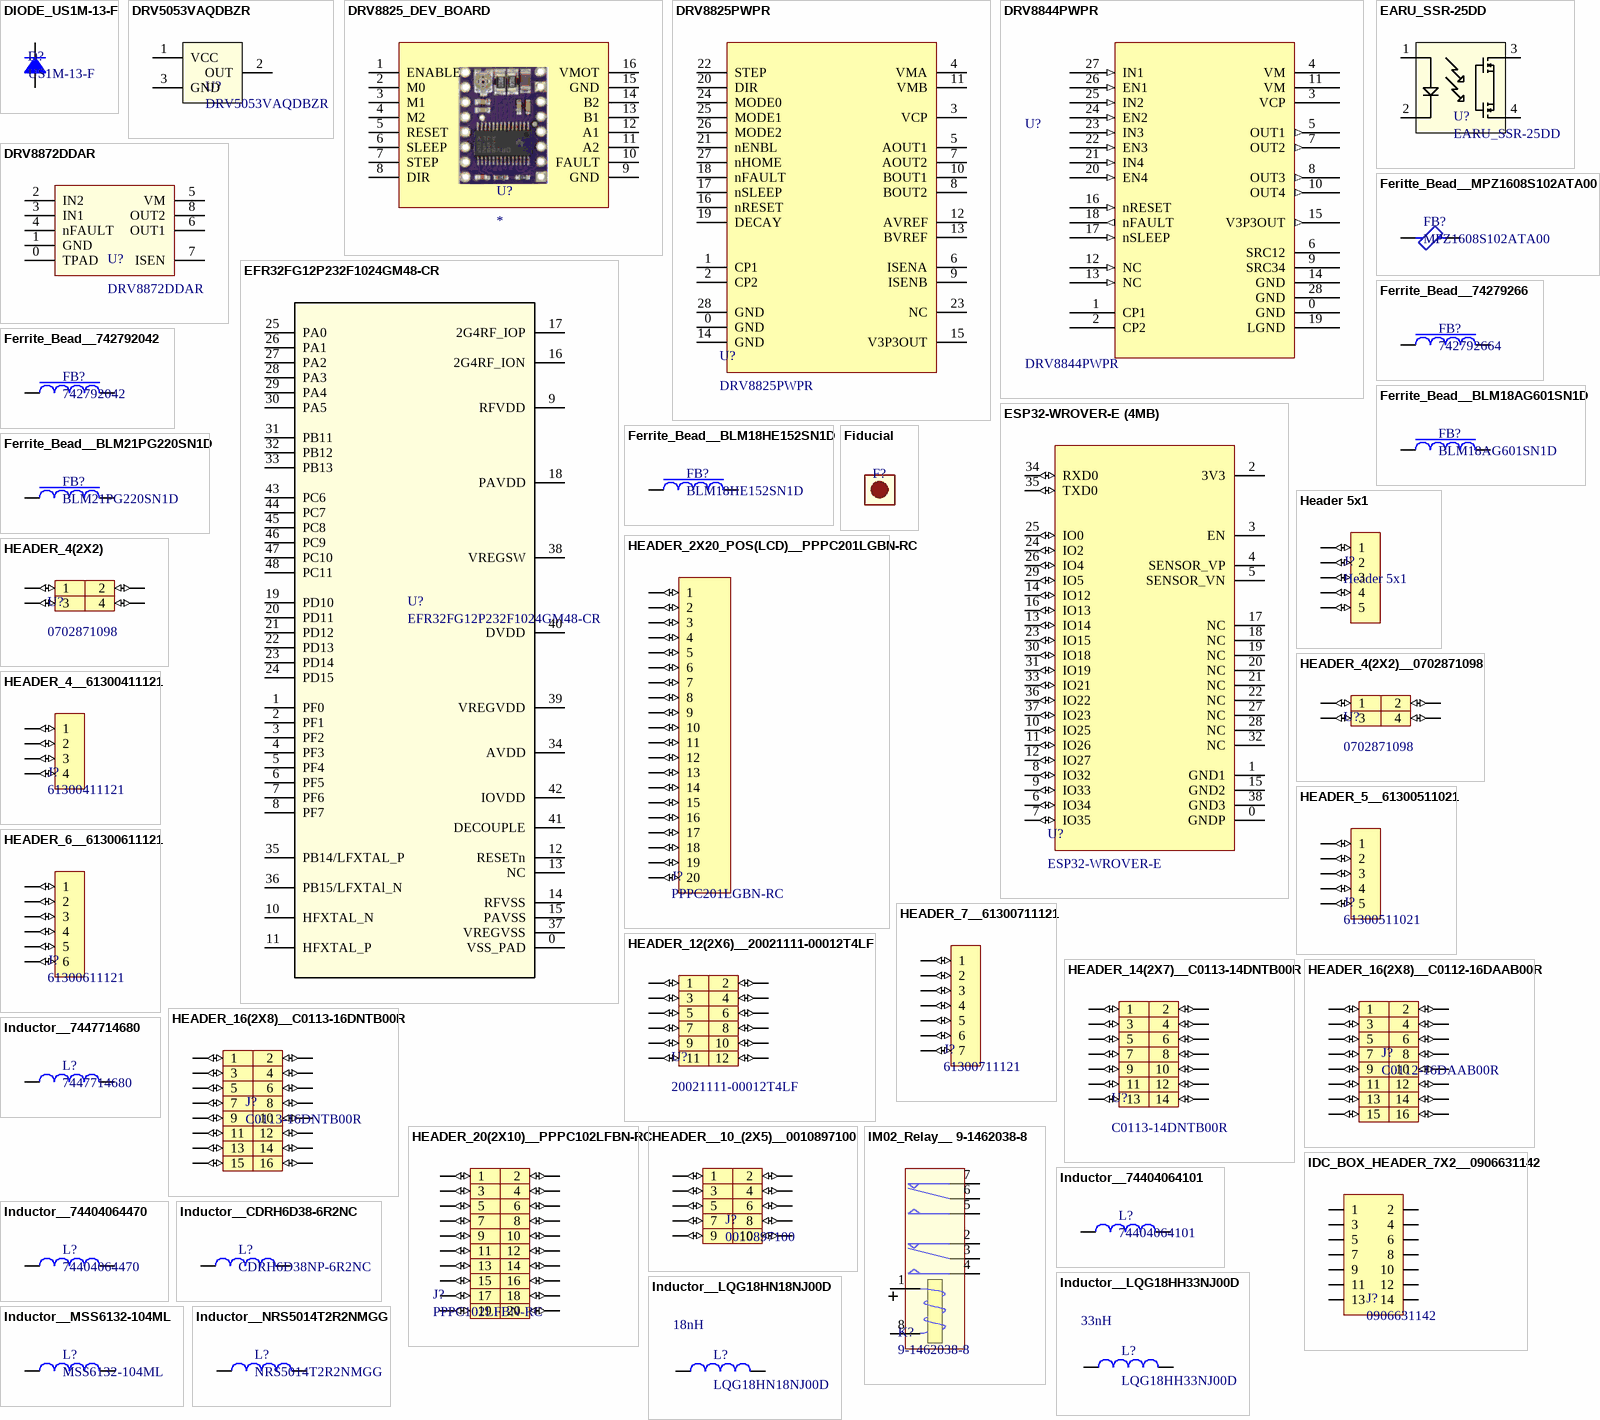
[diagram p4: symbols DIODE_US1M-13-F to Inductor__NRS5014T2R2NMGG]